# Altium footprint library LimeMicroAltiumLib_pcbLib.PcbLib: 274 footprints (part 12 of 18)
Each footprint in its own frame and in the unit in brackets; x right, y up, seen from the top. Pads: shape width x height; smd on the part's side, far side on the other; paste and mask are expansions set on the pad; w line width, h text height; cw(c..) or ccw(c..) is an arc to the next point about the centre after c.
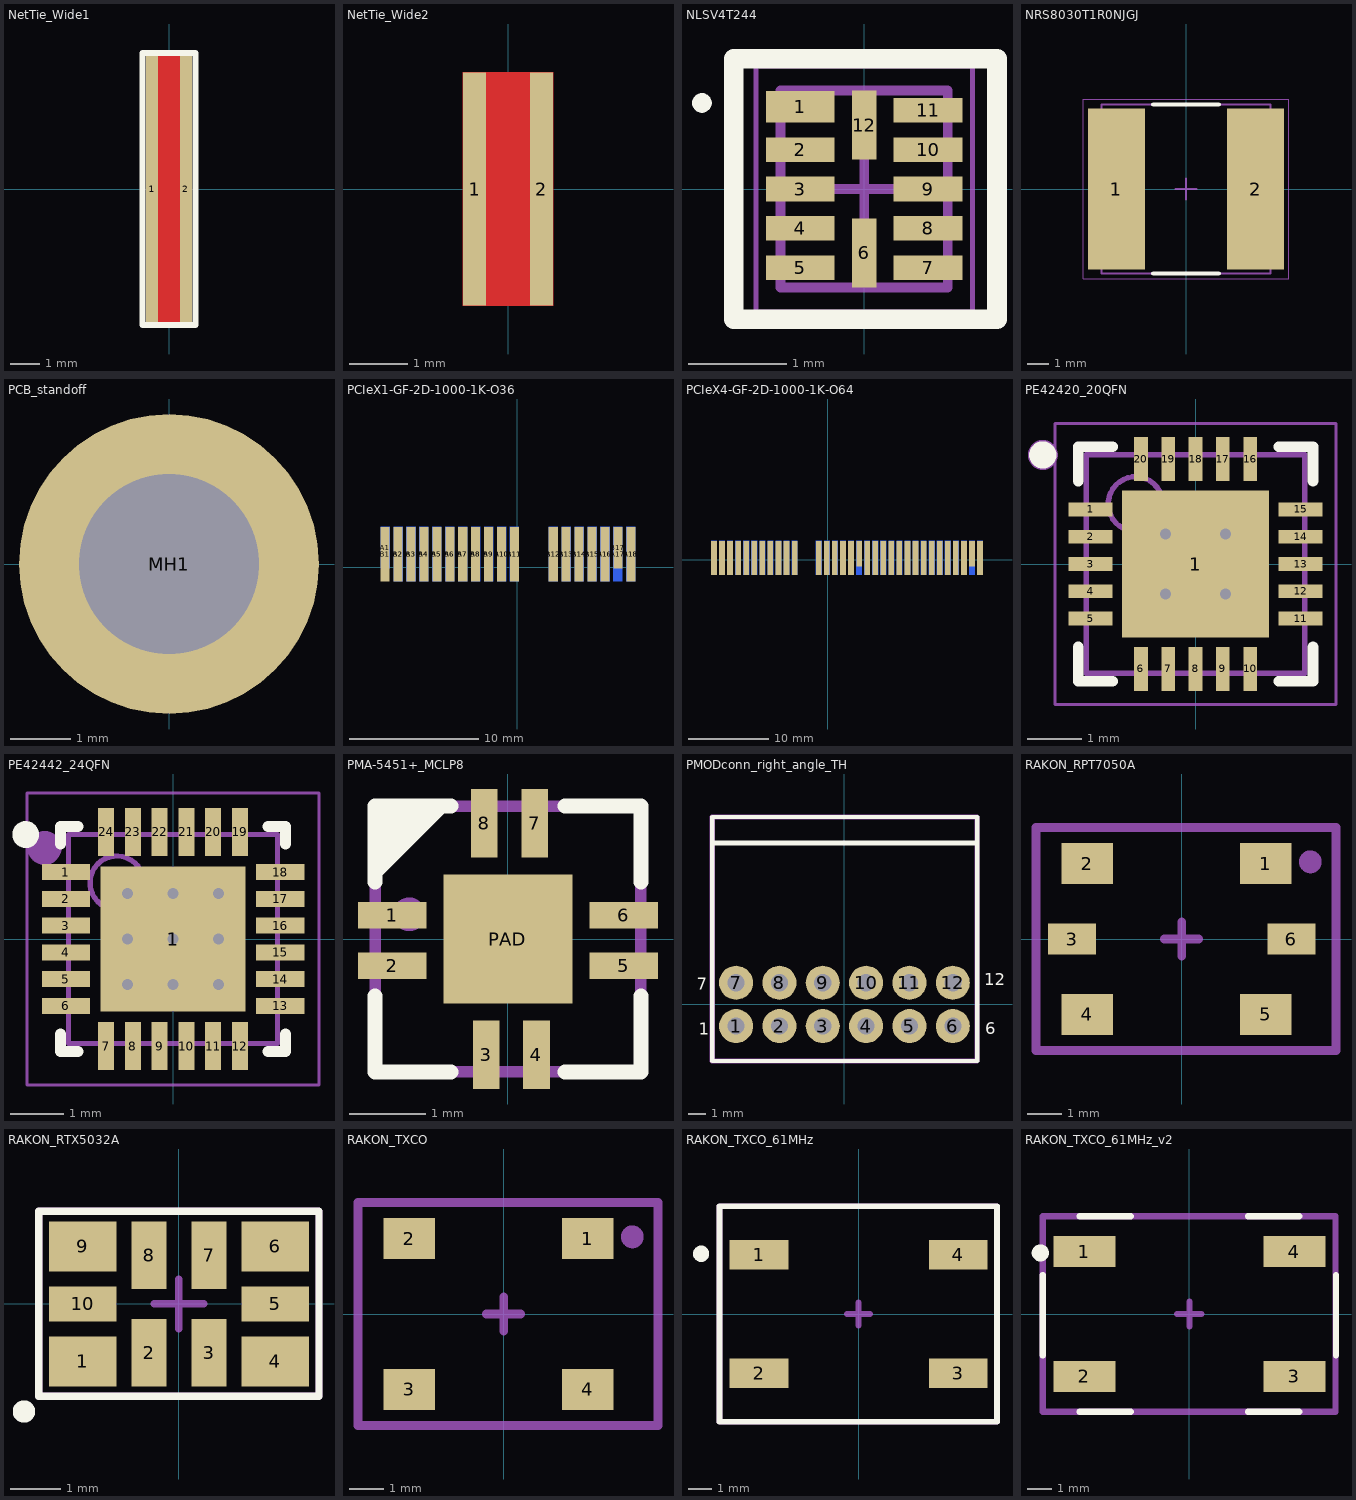
[diagram p11: the footprints below, top view; thin cyan lines are the x and y axes]

## NetTie_Wide1 [mm]
pads (2):
  rect 0.4x9 smd: 1(-0.575,0) 2(0.575,0)
Top Layer:
  region: -0.775,4.5 -0.775,-4.5 0.775,-4.5 0.775,4.5
Top Overlay:
  lines w0.2: -0.9,-4.6 -0.9,4.6 0.9,4.6 0.9,-4.6 -0.9,-4.6

## NetTie_Wide2 [mm]
pads (2):
  rect 0.4x4 smd: 1(-0.575,0) 2(0.575,0)
Top Layer:
  region: -0.775,2 -0.775,-2 0.775,-2 0.775,2

## NLSV4T244 [mm] "PQFN, 12-Leads, Body 1,70x2,00mm, Pitch 0,40mm, IPC Medium Density"
height 0.55
pads (12):
  rect 0.7x0.32 smd mask+0.05: 1(-0.65,0.835)
  rect 0.7x0.25 smd mask+0.05: 2(-0.65,0.4) 3(-0.65,0) 4(-0.65,-0.4) 5(-0.65,-0.8) 7(0.65,-0.8) 8(0.65,-0.4) 9(0.65,0) 10(0.65,0.4) 11(0.65,0.8)
  rect 0.25x0.7 smd mask+0.05: 6(0,-0.65) 12(0,0.65)
Top Overlay:
  circle w0.1: c-1.65,0.875 r0.05
  lines w0.2: -1.325,-1.325 -1.325,1.325 1.35,1.325 1.35,-1.325 -1.325,-1.325
Mechanical 13:
  lines w0.1: -0.85,-1 -0.85,1 0.85,1 0.85,-1 -0.85,-1
Mechanical 15:
  lines w0.05: -1.1,-1.25 -1.1,1.25 1.1,1.25 1.1,-1.25 -1.1,-1.25
  lines w0.1: -0.5,0 0.5,0 ; 0,-0.5 0,0.5
  text ".Designator" at 0,0 h0.7
3D body: height 0.55, standoff 0, extent -0.85,-1 0.85,1

## NRS8030T1R0NJGJ [mm] "Precision Wire Wound Inductor, 2-Leads, Body 8,00x8,00mm, IPC Medium Density"
height 3
pads (2):
  rect 2.7x7.6 smd: 1(-3.3,0) 2(3.3,0)
Top Overlay:
  lines w0.2: -1.55,-4 1.55,-4 ; -1.55,4 1.55,4
Mechanical 13:
  lines w0.1: -4,-4 -4,4 4,4 4,-4 -4,-4
Mechanical 15:
  lines w0.05: -4.875,-4.25 -4.875,4.25 4.875,4.25 4.875,-4.25 -4.875,-4.25
  lines w0.1: -0.5,0 0.5,0 ; 0,-0.5 0,0.5
  text ".Designator" at 0,0 h0.7
3D body: height 3, standoff 0, extent -4,-4 4,4

## PCB_standoff [mm]
pads (1):
  round 5 hole 3 unplated: MH1(0,0)
3D body "User Library-Male - Female Hexagonal Threaded Standoffs; length 15mm; key 5mm; M3x10mm and M3x6mm.step": height 5, standoff -16, extent -2.5,-2.887 2.5,2.887

## PCIeX1-GF-2D-1000-1K-O36 [mm]
pads (36):
  rect 0.7x3.2 smd far side paste-1: A1(-10.2,1.525)
  rect 0.7x4.2 smd far side paste-1: A2(-9.2,1.025) A3(-8.2,1.025) A4(-7.2,1.025) A5(-6.2,1.025) A6(-5.2,1.025) A7(-4.2,1.025) A8(-3.2,1.025) A9(-2.2,1.025) A10(-1.2,1.025) A11(-0.2,1.025) A12(2.8,1.025) A13(3.8,1.025) A14(4.8,1.025) A15(5.8,1.025) A16(6.8,1.025) A17(7.8,1.025) A18(8.8,1.025)
  rect 0.7x4.2 smd paste-1: B1(-10.2,1.025) B2(-9.2,1.025) B3(-8.2,1.025) B4(-7.2,1.025) B5(-6.2,1.025) B6(-5.2,1.025) B7(-4.2,1.025) B8(-3.2,1.025) B9(-2.2,1.025) B10(-1.2,1.025) B11(-0.2,1.025) B12(2.8,1.025) B13(3.8,1.025) B14(4.8,1.025) B15(5.8,1.025) B16(6.8,1.025) B18(8.8,1.025)
  rect 0.7x3.2 smd paste-1: B17(7.8,1.525)
Top Solder:
  rectangle: -11.1,-2.725 9.7,3.25
Bottom Solder:
  rectangle: -11.1,-2.725 9.7,3.25

## PCIeX4-GF-2D-1000-1K-O64 [mm]
pads (64):
  rect 0.7x3.2 smd far side: A1(-14.1,0.75)
  rect 0.7x4.2 smd far side: A2(-13.1,0.25) A3(-12.1,0.25) A4(-11.1,0.25) A5(-10.1,0.25) A6(-9.1,0.25) A7(-8.1,0.25) A8(-7.1,0.25) A9(-6.1,0.25) A10(-5.1,0.25) A11(-4.1,0.25) A12(-1.1,0.25) A13(-0.1,0.25) A14(0.9,0.25) A15(1.9,0.25) A16(2.9,0.25) A17(3.9,0.25) A18(4.9,0.25) A19(5.9,0.25) A20(6.9,0.25) A21(7.9,0.25) A22(8.9,0.25) A23(9.9,0.25) A24(10.9,0.25) A25(11.9,0.25) A26(12.9,0.25) A27(13.9,0.25) A28(14.9,0.25) A29(15.9,0.25) A30(16.9,0.25) A31(17.9,0.25) A32(18.9,0.25)
  rect 0.7x4.2 smd: B1(-14.1,0.25) B2(-13.1,0.25) B3(-12.1,0.25) B4(-11.1,0.25) B5(-10.1,0.25) B6(-9.1,0.25) B7(-8.1,0.25) B8(-7.1,0.25) B9(-6.1,0.25) B10(-5.1,0.25) B11(-4.1,0.25) B12(-1.1,0.25) B13(-0.1,0.25) B14(0.9,0.25) B15(1.9,0.25) B16(2.9,0.25) B18(4.9,0.25) B19(5.9,0.25) B20(6.9,0.25) B21(7.9,0.25) B22(8.9,0.25) B23(9.9,0.25) B24(10.9,0.25) B25(11.9,0.25) B26(12.9,0.25) B27(13.9,0.25) B28(14.9,0.25) B29(15.9,0.25) B30(16.9,0.25) B32(18.9,0.25)
  rect 0.7x3.2 smd: B17(3.9,0.75) B31(17.9,0.75)
Top Solder:
  rectangle: -15,-3.5 19.8,2.475
Bottom Solder:
  rectangle: -15,-3.5 19.8,2.475

## PE42420_20QFN [mm] "QFN, 20-Leads, Body 4,00x4,00mm, Pitch 0,50mm, Thermal Pad 2,70x2,70mm, IPC Medium Density"
height 0.8
pads (21):
  rect 0.8x0.25 smd mask+0.05: 1(-1.925,1) 2(-1.925,0.5) 3(-1.925,0) 4(-1.925,-0.5) 5(-1.925,-1) 11(1.925,-1) 12(1.925,-0.5) 13(1.925,0) 14(1.925,0.5) 15(1.925,1)
  rect 2.7x2.7 smd mask+0.05: 1(0,0)
  rect 0.25x0.8 smd mask+0.05: 6(-1,-1.925) 7(-0.5,-1.925) 8(0,-1.925) 9(0.5,-1.925) 10(1,-1.925) 16(1,1.925) 17(0.5,1.925) 18(0,1.925) 19(-0.5,1.925) 20(-1,1.925)
via -0.55,0.55 diameter 0.4 hole 0.2
via 0.55,0.55 diameter 0.4 hole 0.2
via -0.55,-0.55 diameter 0.4 hole 0.2
via 0.55,-0.55 diameter 0.4 hole 0.2
Top Overlay:
  circle w0.25: c-2.8,2 r0.125
  lines w0.2: -2.15,-1.525 -2.15,-2.15 -1.525,-2.15 ; -2.15,1.525 -2.15,2.15 -1.525,2.15 ; 1.525,-2.15 2.15,-2.15 2.15,-1.525 ; 1.525,2.15 2.15,2.15 2.15,1.525
Mechanical 13:
  circle w0.1: c-1.1,1.1 r0.5
  lines w0.1: -2,-2 -2,2 2,2 2,-2 -2,-2
Mechanical 15:
  circle w0.35: c-2.8,2 r0.1
  lines w0.05: -2.575,-2.575 -2.575,2.575 2.575,2.575 2.575,-2.575 -2.575,-2.575
  lines w0.1: -0.5,0 0.5,0 ; 0,-0.5 0,0.5
  text ".Designator" at 0,0 h0.7
3D body "User Library-QFN24-0_5.STEP": height 1, standoff 0, extent -2,-2 2,2

## PE42442_24QFN [mm] "QFN, 24-Leads, Body 4,00x4,00mm, Pitch 0,50mm, thermal pad, IPC Medium Density"
height 0.8
pads (25):
  rect 0.9x0.3 smd mask+0.05: 1(-2,1.25) 2(-2,0.75) 3(-2,0.25) 4(-2,-0.25) 5(-2,-0.75) 6(-2,-1.25) 13(2,-1.25) 14(2,-0.75) 15(2,-0.25) 16(2,0.25) 17(2,0.75) 18(2,1.25)
  rect 2.7x2.7 smd mask+0.05: 1(0,0)
  rect 0.3x0.9 smd mask+0.05: 7(-1.25,-2) 8(-0.75,-2) 9(-0.25,-2) 10(0.25,-2) 11(0.75,-2) 12(1.25,-2) 19(1.25,2) 20(0.75,2) 21(0.25,2) 22(-0.25,2) 23(-0.75,2) 24(-1.25,2)
via 0.85,0.85 diameter 0.5 hole 0.2
via -0.85,0.85 diameter 0.5 hole 0.2
via 0,0.85 diameter 0.5 hole 0.2
via 0,-0.85 diameter 0.5 hole 0.2
via 0.85,-0.85 diameter 0.5 hole 0.2
via -0.85,-0.85 diameter 0.5 hole 0.2
via -0.85,0 diameter 0.5 hole 0.2
via 0.85,0 diameter 0.5 hole 0.2
via 0,0 diameter 0.5 hole 0.2
Top Overlay:
  circle w0.25: c-2.75,1.95 r0.125
  lines w0.2: -2.1,-1.775 -2.1,-2.1 -1.775,-2.1 ; -2.1,1.775 -2.1,2.1 -1.775,2.1 ; 1.775,-2.1 2.1,-2.1 2.1,-1.775 ; 1.775,2.1 2.1,2.1 2.1,1.775
Mechanical 13:
  circle w0.1: c-1.05,1.05 r0.5
  lines w0.1: -1.95,-1.95 -1.95,1.95 1.95,1.95 1.95,-1.95 -1.95,-1.95
Mechanical 15:
  circle w0.35: c-2.4,1.7 r0.141
  lines w0.05: -2.725,-2.725 -2.725,2.725 2.725,2.725 2.725,-2.725 -2.725,-2.725
  lines w0.1: -0.5,0 0.5,0 ; 0,-0.5 0,0.5
  text ".Designator" at 0,0 h0.7
3D body "User Library-QFN24-0_5.STEP": height 1, standoff 0, extent -2,-2 2,2

## PMA-5451+_MCLP8 [mm]
pads (9):
  rect 0.9x0.35 smd mask+0.05: 1(-1.525,0.31) 2(-1.525,-0.35) 5(1.525,-0.35) 6(1.525,0.31)
  rect 0.35x0.9 smd mask+0.05: 3(-0.285,-1.525) 4(0.375,-1.525) 7(0.35,1.525) 8(-0.31,1.525)
  rect 1.7x1.7 smd mask+0.05: PAD(0,0)
Top Overlay:
  region: -1.75,0.75 -0.75,1.75 -1.75,1.75
  lines w0.2: -1.75,-0.75 -1.75,-1.75 -0.75,-1.75 ; -1.75,0.75 -1.75,1.75 -0.75,1.75 ; 0.75,-1.75 1.75,-1.75 1.75,-0.75 ; 0.75,1.75 1.75,1.75 1.75,0.75
Mechanical 15:
  circle w0.3: c-1.3,0.325 r0.071
  lines w0.15: -1.75,-1.75 1.75,-1.75 1.75,1.75 -1.75,1.75 -1.75,-1.75
  lines w0.2: -0.5,0 0,0 ; 0,-0.5 0,0 ; 0,0.5 0,0 ; 0.5,0 0,0
  text ".Designator" at 0,0 h0.55
3D body: height 0.95, standoff 0.9, extent -1.198,0.801 -0.8,1.2
3D body: height 0.9, standoff 0, extent -1.5,-1.5 1.5,1.5

## PMODconn_right_angle_TH [mm] "JTAG"
pads (12):
  round 2 hole 1: 1(-6.357,-1.271) 2(-3.814,-1.271) 3(-1.271,-1.271) 4(1.271,-1.271) 5(3.814,-1.271) 6(6.357,-1.271) 7(-6.357,1.271) 8(-3.814,1.271) 9(-1.271,1.271) 10(1.271,1.271) 11(3.814,1.271) 12(6.357,1.271)
Top Overlay:
  lines w0.254: -7.757,-3.321 -7.757,11 7.786,11 7.786,-3.321 -7.757,-3.321
  lines w0.3: -7.7,9.475 7.75,9.475
  text "1" at -8.55,-1.775 h0.7
  text "6" at 8.25,-1.75 h0.7
  text "12" at 8.2,1.125 h0.7
  text "7" at -8.65,0.85 h0.7
Mechanical 15:
  lines w0.3: -7.757,-3.321 7.786,-3.321 7.786,11 -7.757,11 -7.757,-3.321
  text ".Designator" at 0.1,0.025 h0.7
  text "1" at -6.5,-1.75 h0.7
  text "12" at 6.025,0.9 h0.7
3D body "BG151-10-X-0320-X-X_revF.step": height 5, standoff -3.2, extent -5.382,-1.39 7.818,11.45
3D body "BG151-10-X-0320-X-X_revF.step": height 5, standoff -3.2, extent -7.925,-1.39 5.275,11.45

## RAKON_RPT7050A [mm] "Rakon's Pluto+ ASIC"
pads (6):
  rect 1.5x1.2 smd: 1(2.45,2.2) 2(-2.75,2.2) 4(-2.75,-2.2) 5(2.45,-2.2)
  rect 1.4x0.9 smd: 3(-3.2,0) 6(3.2,0)
Mechanical 15:
  circle w0.35: c3.75,2.25 r0.158
  lines w0.254: -0.5,0 0.5,0 ; 0,-0.5 0,0.5 ; -4.25,-3.25 4.5,-3.25 4.5,3.25 -4.25,3.25 -4.25,-3.25
  text ".Designator" at 0,0 h0.7
3D body: height 0.1, standoff 0, extent 4.15,1.8 4.25,1.9

## RAKON_RTX5032A [mm] "RAKON RTX5032A 40MHz Filter enabled, with VC, 10pin 5mm x 3.2mm"
height 1.65
pads (10):
  rect 1.35x1 smd mask+0.05: 1(-1.925,-1.15) 4(1.925,-1.15) 6(1.925,1.15) 9(-1.925,1.15)
  rect 0.7x1.35 smd mask+0.05: 2(-0.6,-0.975) 3(0.6,-0.975) 7(0.6,0.975) 8(-0.6,0.975)
  rect 1.35x0.7 smd mask+0.05: 5(1.925,0) 10(-1.925,0)
Top Overlay:
  circle w0.25: c-3.1,-2.15 r0.1
  lines w0.15: -2.8,-1.85 -2.8,1.85 2.8,1.85 2.8,-1.85 -2.8,-1.85
Mechanical 15:
  circle w0.25: c-1.9,-1.1 r0.1
  lines w0.15: -0.5,0 0,0 ; 0,-0.5 0,0 ; 0,0.5 0,0 ; 0.5,0 0,0 ; -2.8,-1.85 -2.8,1.85 2.8,1.85 2.8,-1.85 -2.8,-1.85
  text ".Designator" at 0,0 h0.55
3D body "User Library-Crystal.step": height 0.9, standoff -0.05, extent -2.5,-1.6 2.5,1.6

## RAKON_TXCO [mm] "30.72 MHz or 61.44 MHz"
pads (4):
  rect 1.5x1.2 smd: 1(2.45,2.2) 2(-2.75,2.2) 3(-2.75,-2.2) 4(2.45,-2.2)
Mechanical 15:
  circle w0.35: c3.75,2.25 r0.158
  lines w0.254: -0.5,0 0.5,0 ; 0,-0.5 0,0.5 ; -4.25,-3.25 4.5,-3.25 4.5,3.25 -4.25,3.25 -4.25,-3.25
  text ".Designator" at 0,0 h0.7
3D body "CAP 0402 (1005 metric).STEP": height 2.15, standoff 1.6, extent -0.825,-1.975 0.225,-1.425
3D body "CAP 0402 (1005 metric).STEP": height 2.15, standoff 1.6, extent 0.975,-1.975 2.025,-1.425
3D body "CAP 0402 (1005 metric).STEP": height 2.15, standoff 1.6, extent 2.125,0.775 2.675,1.825
3D body "CAP 0402 (1005 metric).STEP": height 2.15, standoff 1.6, extent 2.125,-1.025 2.675,0.025
3D body "Crystal TXC Corp 7M series.STEP": height 2.4, standoff 1.6, extent -2.95,-0.6 0.35,2
3D body "RES 0402 (1005 metric).STEP": height 2, standoff 1.6, extent -2.525,-1.975 -1.475,-1.425
3D body: height 1.6, standoff 0, extent -3.5,-2.3 3.2,2.3

## RAKON_TXCO_61MHz [mm] "61.44 MHz"
pads (4):
  rect 2.54x1.27 smd: 1(-4.3,2.55) 2(-4.3,-2.55) 3(4.3,-2.55) 4(4.3,2.55)
Top Overlay:
  circle w0.35: c-6.8,2.6 r0.177
  lines w0.254: -6,-4.65 5.975,-4.65 5.975,4.65 -6,4.65 -6,-4.65
Mechanical 15:
  circle w0.35: c-4.225,2.55 r0.158
  lines w0.254: -0.5,0 0.5,0 ; 0,-0.5 0,0.5 ; -6,-4.65 -6,4.65 5.975,4.65 5.975,-4.65 -6,-4.65
  text ".Designator" at 0,0 h0.7
3D body: height 0.1, standoff 0, extent -0.5,-4 0,-3.8
3D body: height 0.1, standoff 0, extent -5.8,2.5 -5.7,2.6

## RAKON_TXCO_61MHz_v2 [mm] "61.44 MHz"
pads (4):
  rect 2.54x1.27 smd: 1(-4.3,2.55) 2(-4.3,-2.55) 3(4.3,-2.55) 4(4.3,2.55)
Top Overlay:
  circle w0.35: c-6.1,2.5 r0.177
  lines w0.254: -6,-1.7 -6,1.6 ; -4.5,-4 -2.4,-4 ; -4.5,4 -2.4,4 ; 2.4,-4 4.5,-4 ; 2.4,4 4.5,4 ; 6,-1.7 6,1.6
Mechanical 15:
  circle w0.35: c-4.225,2.55 r0.158
  lines w0.254: -0.5,0 0.5,0 ; 0,-0.5 0,0.5 ; -6,-4 5.975,-4 5.975,4 -6,4 -6,-4
  text ".Designator" at 0,0 h0.7
3D body: height 0.1, standoff 0, extent -5.8,2.5 -5.7,2.6
3D body: height 0.1, standoff 0, extent -0.5,-4 0,-3.8